# Altium footprint library Tomra_Cadstar_Footprints.PcbLib: 373 footprints (part 15 of 24)
Each footprint in its own frame and in the unit in brackets; x right, y up, seen from the top. Pads: shape width x height; smd on the part's side, far side on the other; paste and mask are expansions set on the pad; w line width, h text height; cw(c..) or ccw(c..) is an arc to the next point about the centre after c.
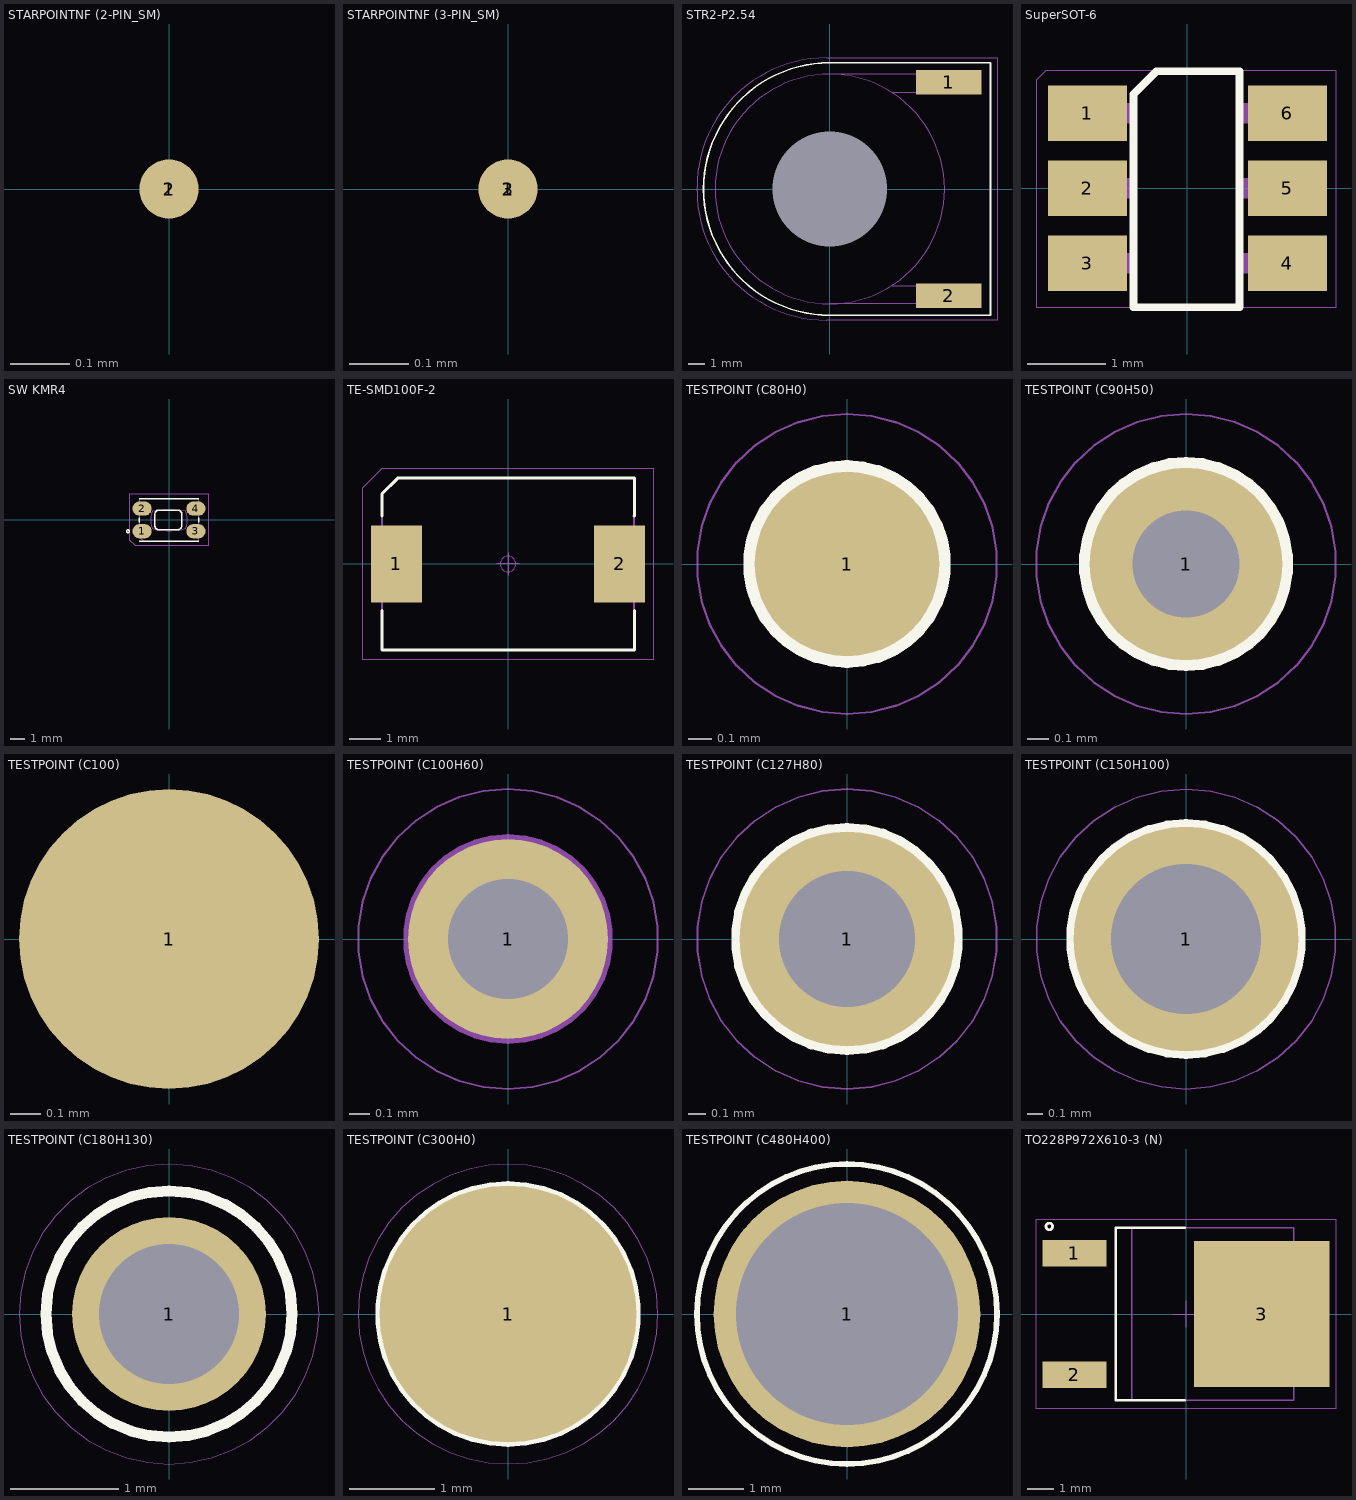
[diagram p14: the footprints below, top view; thin cyan lines are the x and y axes]

## STARPOINTNF (2-PIN_SM) [mm]
pads (2):
  round 0.1 smd paste+0 mask+0: 1(0,0) 2(0,0)
Top Silk:
  text ".Designator" at 0,0 h0.7
Top Placement:
  lines w0.01: 0,-0.01 cw(c0,0) 0,0.01 cw(c0,0) 0,-0.01

## STARPOINTNF (3-PIN_SM) [mm]
pads (3):
  round 0.1 smd paste+0 mask+0: 1(0,0) 2(0,0) 3(0,0)
Top Silk:
  text ".Designator" at 0,0 h0.7
Top Placement:
  lines w0.01: 0,-0.01 cw(c0,0) 0,0.01 cw(c0,0) 0,-0.01

## STR2-P2.54 [mm]
height 5
pads (3):
  rect 4x1.5 smd paste+0 mask+0: 1(7.25,6.5) 2(7.25,-6.5)
  round 0 / inner round 1.524 / far side round 0 hole 7 paste+0 mask+0: 3(0,0)
Top Silk:
  lines w0.1: -7.7,0 ccw(c0,0) 0,-7.7 9.8,-7.7 9.8,7.7 0,7.7 ccw(c0,0) -7.7,0
  text ".Designator" at -0.2,8 h0.7
Top Assembly:
  lines w0.05: 3.8,-5.9 8.9,-5.9 8.9,-7 0,-7 ; 3.8,5.9 8.9,5.9 8.9,7 0,7 ; 0,-7 cw(c0,0) 0,7 ; 0,-7 ccw(c0,0) 0,7
Top Placement:
  lines w0.01: -8.1,-0.1 ccw(c-0.2,-0.1) -0.2,-8 10.2,-8 10.2,8 -0.2,8 ccw(c-0.2,0.1) -8.1,0.1 -8.1,-0.1

## SuperSOT-6 [mm]
height 1.22
pads (6):
  rect 1x0.7 smd paste+0 mask+0: 1(-1.27,0.953) 2(-1.27,0) 3(-1.27,-0.953) 4(1.27,-0.953) 5(1.27,0) 6(1.27,0.953)
Top Silk:
  lines w0.1: -0.686,-1.511 -0.686,1.194 -0.394,1.486 0.66,1.486 0.66,-1.511 -0.686,-1.511
  text ".Designator" at 0,0 h0.7
Top Assembly:
  region: 1.175,-0.825 1.175,-1.079 0.642,-1.079 0.642,-0.825
  region: -0.705,1.08 -0.705,0.826 -1.238,0.826 -1.238,1.08
  region: -0.705,-0.825 -0.705,-1.079 -1.238,-1.079 -1.238,-0.825
  region: 1.175,0.128 1.175,-0.126 0.642,-0.126 0.642,0.128
  region: -0.705,0.128 -0.705,-0.126 -1.238,-0.126 -1.238,0.128
  region: 1.175,1.08 1.175,0.826 0.642,0.826 0.642,1.08
  lines w0.05: -0.705,-1.511 -0.705,1.194 -0.412,1.486 0.642,1.486 0.642,-1.511 -0.705,-1.511
Top Placement:
  lines w0.01: -1.924,-1.511 -1.924,1.369 -1.8,1.493 1.886,1.493 1.886,-1.511 -1.924,-1.511

## SW KMR4 [mm]
height 2.5
pads (4):
  oval 1.356x1 smd paste+0 mask+0: 1(-1.9,-0.8) 2(-1.9,0.8) 3(1.9,-0.8) 4(1.9,0.8)
Top Silk:
  lines w0.1: -2.1,-1.5 2.1,-1.5 ; -2.1,-0.15 -2.1,0.15 ; -2.1,1.5 2.1,1.5 ; 2.1,-0.15 2.1,0.15 ; -2.9,-0.9 cw(c-2.9,-0.8) -2.9,-0.7 cw(c-2.9,-0.8) -2.9,-0.9 ; -1,-0.4 ccw(c-0.7,-0.4) -0.7,-0.7 0.6,-0.7 ccw(c0.6,-0.4) 0.9,-0.4 0.9,0.4 ccw(c0.6,0.4) 0.6,0.7 -0.7,0.7 ccw(c-0.7,0.4) -1,0.4 -1,-0.4
  text ".Designator" at -2.1,1.5 h0.7
Top Assembly:
  lines w0.05: -2.1,-1.2 -1.8,-1.5 2.1,-1.5 2.1,1.5 -2.1,1.5 -2.1,-1.2 ; -1.2,-0.6 ccw(c0,3.35) 1.2,-0.6 ccw(c-0.55,0) 1.2,0.6 ccw(c0,-6.5) -1.2,0.6 ccw(c0.55,0) -1.2,-0.6
Top Placement:
  lines w0.01: -2.8,-1.4 -2.4,-1.8 2.8,-1.8 2.8,1.8 -2.8,1.8 -2.8,-1.4

## TE-SMD100F-2 [mm]
height 3
pads (2):
  rect 1.62x2.43 smd paste+0 mask+0: 1(-3.535,0) 2(3.535,0)
Top Silk:
  lines w0.1: -3.99,-2.68 -3.99,-1.48 -3.99,-2.72 ; -3.99,1.52 -3.99,2.22 -3.49,2.72 4.01,2.72 4.01,1.52 3.99,1.52 ; 3.99,-2.72 -3.99,-2.72 ; 4.01,-2.68 4.01,-1.48 4.01,-2.72 -3.99,-2.72
  text ".Designator" at -3.599,-0.35 h0.7
Top Assembly:
  lines w0.05: -3.99,-2.72 -3.99,2.22 -3.49,2.72 3.99,2.72 3.99,-2.72 -3.99,-2.72
Top Placement:
  lines w0.01: -0.35,0 0.35,0 ; 0,-0.35 0,0.35 ; -4.6,-3.03 -4.6,2.42 -3.99,3.03 4.6,3.03 4.6,-3.03 -4.6,-3.03 ; -0.25,0 cw(c0,0) 0.25,0 cw(c0,0) -0.25,0

## TESTPOINT (C80H0) [mm]
pads (1):
  round 0.8 smd paste-0.8 mask+0: 1(0,0)
Top Silk:
  lines w0.1: 0,-0.4 cw(c0,0) 0,0.4 cw(c0,0) 0,-0.4
  text ".Designator" at 0,0 h0.7
Top Assembly:
  lines w0.05: 0,-0.4 cw(c0,0) 0,0.4 cw(c0,0) 0,-0.4
Top Placement:
  lines w0.01: 0,-0.65 cw(c0,0) 0,0.65 cw(c0,0) 0,-0.65

## TESTPOINT (C90H50) [mm]
pads (1):
  round 0.9 / inner round 1.524 / far side round 0.9 hole 0.5 paste+0 mask+0: 1(0,0)
Top Silk:
  lines w0.1: 0,-0.45 cw(c0,0) 0,0.45 cw(c0,0) 0,-0.45
  text ".Designator" at 0,0 h0.7
Top Assembly:
  lines w0.05: 0,-0.45 cw(c0,0) 0,0.45 cw(c0,0) 0,-0.45
Top Placement:
  lines w0.01: 0,-0.7 cw(c0,0) 0,0.7 cw(c0,0) 0,-0.7

## TESTPOINT (C100) [mm]
pads (1):
  round 1 smd paste+0 mask+0: 1(0,0)
Top Silk:
  text ".Designator" at 0,0 h0.7

## TESTPOINT (C100H60) [mm]
pads (1):
  round 1 / inner round 1.524 / far side round 1 hole 0.6 paste+0 mask+0: 1(0,0)
Top Silk:
  text ".Designator" at 0,0 h0.7
Top Assembly:
  lines w0.05: 0,-0.5 cw(c0,0) 0,0.5 cw(c0,0) 0,-0.5
Top Placement:
  lines w0.01: 0,-0.75 cw(c0,0) 0,0.75 cw(c0,0) 0,-0.75

## TESTPOINT (C127H80) [mm]
pads (1):
  round 1.27 / inner round 1.524 / far side round 1.27 hole 0.8 paste+0 mask+0: 1(0,0)
Top Silk:
  lines w0.1: 0,-0.635 cw(c0,0) 0,0.635 cw(c0,0) 0,-0.635
  text ".Designator" at 0,0 h0.7
Top Assembly:
  lines w0.05: 0,-0.635 cw(c0,0) 0,0.635 cw(c0,0) 0,-0.635
Top Placement:
  lines w0.01: 0,-0.885 cw(c0,0) 0,0.885 cw(c0,0) 0,-0.885

## TESTPOINT (C150H100) [mm]
pads (1):
  round 1.5 / inner round 1.524 / far side round 1.5 hole 1 paste+0 mask+0: 1(0,0)
Top Silk:
  lines w0.1: 0,-0.75 cw(c0,0) 0,0.75 cw(c0,0) 0,-0.75
  text ".Designator" at 0,0 h0.7
Top Assembly:
  lines w0.05: 0,-0.75 cw(c0,0) 0,0.75 cw(c0,0) 0,-0.75
Top Placement:
  lines w0.01: 0,-1 cw(c0,0) 0,1 cw(c0,0) 0,-1

## TESTPOINT (C180H130) [mm]
pads (1):
  round 1.8 / inner round 1.524 / far side round 1.8 hole 1.3 paste+0 mask+0: 1(0,0)
Top Silk:
  lines w0.1: 0,-1.143 cw(c0,0) 0,1.143 cw(c0,0) 0,-1.143
  text ".Designator" at 0,0 h0.7
Top Assembly:
  lines w0.05: 0,-1.143 cw(c0,0) 0,1.143 cw(c0,0) 0,-1.143
Top Placement:
  lines w0.01: 0,-1.393 cw(c0,0) 0,1.393 cw(c0,0) 0,-1.393

## TESTPOINT (C300H0) [mm]
pads (1):
  round 3 smd paste-3 mask+0: 1(0,0)
Top Silk:
  lines w0.1: 0,-1.5 cw(c0,0) 0,1.5 cw(c0,0) 0,-1.5
  text ".Designator" at 0,0 h0.7
Top Assembly:
  lines w0.05: 0,-1.5 cw(c0,0) 0,1.5 cw(c0,0) 0,-1.5
Top Placement:
  lines w0.01: 0,-1.75 cw(c0,0) 0,1.75 cw(c0,0) 0,-1.75

## TESTPOINT (C480H400) [mm]
pads (1):
  round 4.8 / inner round 1.524 / far side round 4.8 hole 4 paste+0 mask+0: 1(0,0)
Top Silk:
  lines w0.05: 0,-2.7 cw(c0,0) 0,2.7 cw(c0,0) 0,-2.7
  lines w0.1: 0,-2.7 cw(c0,0) 0,2.7 cw(c0,0) 0,-2.7
Top Assembly:
  lines w0.05: 0,-2.7 cw(c0,0) 0,2.7 ; 0,-2.7 ccw(c0,0) 0,2.7 ; 0,-2.7 cw(c0,0) 0,2.7 ; 0,-2.7 ccw(c0,0) 0,2.7
  text ".Designator" at -2.3,2.68 h0.7
Top Placement:
  lines w0.01: 0,-2.7 cw(c0,0) 0,2.7 cw(c0,0) 0,-2.7

## TO228P972X610-3 (N) [mm]
height 2.4
pads (3):
  rect 2.4x1 smd paste+0 mask+0: 1(-4.2,2.28) 2(-4.2,-2.28)
  rect 5.1x5.5 smd paste+0 mask+0: 3(2.85,0)
Top Silk:
  lines w0.1: -0.05,-3.25 -2.65,-3.25 -2.65,3.25 -0.05,3.25 ; -5.275,3.3 cw(c-5.15,3.3) -5.025,3.3 cw(c-5.15,3.3) -5.275,3.3
  text ".Designator" at -3.599,-0.35 h0.7
Top Assembly:
  lines w0.05: 4.062,-2.65 4.59,-2.65 4.862,-2.05 4.862,2.05 4.59,2.65 4.062,2.65 ; -2.038,-3.25 4.062,-3.25 4.062,3.25 -2.038,3.25 -2.038,-3.25
Top Placement:
  lines w0.01: -0.5,0 0.5,0 ; 0,-0.5 0,0.5 ; -5.65,-3.55 5.65,-3.55 5.65,3.55 -5.65,3.55 -5.65,-3.55